# Altium footprint library AltiumLibraries.PcbLib: 247 footprints (part 1 of 16)
Each footprint in its own frame and in the unit in brackets; x right, y up, seen from the top. Pads: shape width x height; smd on the part's side, far side on the other; paste and mask are expansions set on the pad; w line width, h text height; cw(c..) or ccw(c..) is an arc to the next point about the centre after c.
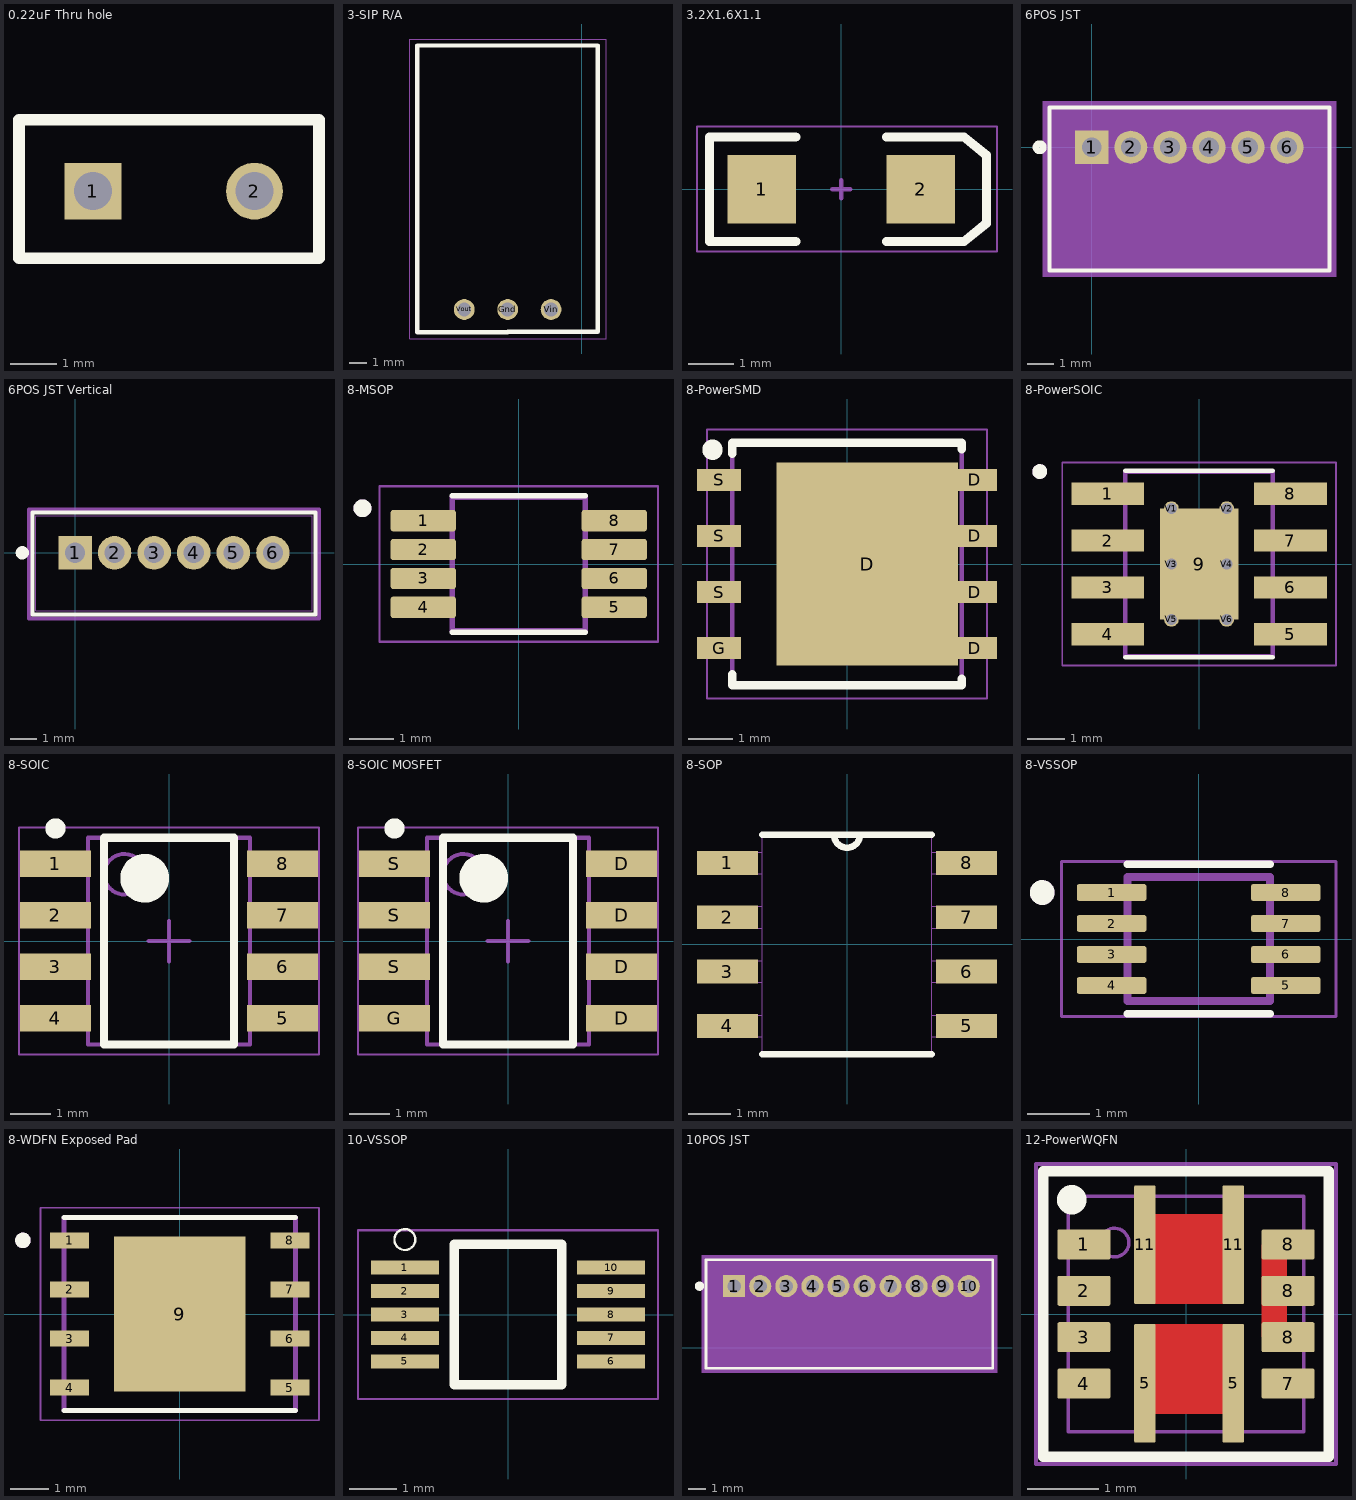
[diagram p0: the footprints below, top view; thin cyan lines are the x and y axes]

## 0.22uF Thru hole [mm]
pads (2):
  rect 1.23x1.23 hole 0.82: 1(-66.898,-218.047)
  round 1.23 hole 0.82: 2(-63.398,-218.047)
Top Overlay:
  lines w0.254: -68.5,-219.5 -62,-219.5 -62,-216.5 -68.5,-216.5 -68.5,-219.5

## 3-SIP R/A [mm]
pads (3):
  round 1.2 hole 0.8: Gnd(-4.273,-16.843) Vin(-1.773,-16.843) Vout(-6.773,-16.843)
Top Overlay:
  lines w0.254: -9.483,-11.193 -9.473,-11.193 ; -4.283,-18.143 -9.483,-18.143 -9.483,-1.643 0.917,-1.643 0.917,-18.133 -4.273,-18.133
Mechanical 15:
  lines w0.051: -9.906,-18.542 1.397,-18.542 1.397,-1.27 -9.906,-1.27 -9.906,-18.542
3D body: height 8.6, standoff 0, extent -9.463,-18.123 0.897,-1.583

## 3.2X1.6X1.1 [mm]
pads (2):
  rect 1.5x1.5 smd: 1(-1.75,0) 2(1.75,0)
Top Overlay:
  lines w0.2: -1,-1.15 -2.9,-1.15 -2.9,1.15 -1,1.15 ; 1,-1.15 2.7,-1.15 3.2,-0.75 3.2,0.75 2.7,1.15 1,1.15
Mechanical 1:
  lines w0.1: -0.2,0 0.2,0 ; 0,-0.2 0,0.2
Mechanical 15:
  lines w0.051: -3.175,-1.37 -3.175,1.38 3.43,1.38 3.43,-1.37 -3.175,-1.37
3D body "KP-3216P3C(AP214).STEP": height 1.04, standoff 0.01, extent -1.675,-0.75 1.525,0.85

## 6POS JST [mil]
pads (6):
  rect 50x50 hole 30 mask+0: 1(0,0)
  round 50 hole 30 mask+0: 2(59.06,0) 3(118.11,0) 4(177.17,0) 5(236.22,0) 6(295.28,0)
Top Overlay:
  circle w10: c-78.74,0 r5.57
  lines w6: -63.86,-186.1 359.14,-186.1 359.14,59.9 -63.86,59.9 -63.86,-186.1
Mechanical 5:
  region: -73.86,69.9 369.14,69.9 369.14,-196.1 -73.86,-196.1
Mechanical 13:
  lines w1: -58.86,-181.1 354.14,-181.1 354.14,54.9 -58.86,54.9 -58.86,-181.1
Mechanical 15:
  region: 364.14,64.9 -68.86,64.9 -68.86,-191.1 364.14,-191.1
  lines w6: -68.86,-191.1 -68.86,64.9 364.14,64.9 364.14,-191.1 -68.86,-191.1
3D body "S6B-ZR.STEP": height 147.64, standoff -104.33, extent -59.05,-181.1 354.34,55.12

## 6POS JST Vertical [mil]
pads (6):
  rect 50x50 hole 30 mask+0: 1(0,0)
  round 50 hole 30 mask+0: 2(59.06,0) 3(118.11,0) 4(177.17,0) 5(236.22,0) 6(295.28,0)
Top Overlay:
  circle w10: c-78.74,0 r4.92
  lines w6: -63.86,-92.3 359.14,-92.3 359.14,59.9 -63.86,59.9 -63.86,-92.3
Mechanical 13:
  lines w1: -58.86,-86.61 -58.86,54.9 354.14,54.9 354.14,-86.61 -58.86,-86.61
Mechanical 15:
  lines w6: -68.86,-98.43 -68.86,64.9 364.14,64.9 364.14,-98.43 -68.86,-98.43
3D body "B6B-ZR.STEP": height 177.17, standoff -106.3, extent -59.06,-86.62 354.33,51.18
3D body: height 10, standoff 0, extent 0,0 10,10

## 8-MSOP [mm]
pads (8):
  rrect25% 1.47x0.48 smd: 1(-2.15,0.975) 2(-2.15,0.325) 3(-2.15,-0.325) 4(-2.15,-0.975) 5(2.15,-0.975) 6(2.15,-0.325) 7(2.15,0.325) 8(2.15,0.975)
Top Overlay:
  circle w0.2: c-3.52,1.255 r0.1
  lines w0.127: -1.5,-1.535 1.5,-1.535 ; -1.5,1.535 1.5,1.535
Mechanical 13:
  circle w0.2: c-3.52,1.255 r0.1
  lines w0.127: -1.5,-1.5 -1.5,1.5 1.5,1.5 1.5,-1.5 -1.5,-1.5
Mechanical 15:
  lines w0.05: -3.135,-1.75 -3.135,1.75 3.135,1.75 3.135,-1.75 -3.135,-1.75
3D body "RM_8_ADI.step": height 1.09, standoff 0, extent -2.553,-1.6 2.604,1.6

## 8-PowerSMD [mm]
pads (9):
  rect 4.12x4.6 smd: D(0.46,0)
  rect 1x0.5 smd: D(2.9,-1.905) D(2.9,-0.635) D(2.9,0.635) D(2.9,1.905) G(-2.9,-1.905) S(-2.9,-0.635) S(-2.9,0.635) S(-2.9,1.905)
Top Overlay:
  circle w0.3: c-3.05,2.59 r0.08
  lines w0.2: -2.6,-2.5 -2.6,-2.75 2.6,-2.75 2.6,-2.6 ; -2.6,2.5 -2.6,2.75 2.6,2.75 2.6,2.6
Mechanical 4:
  lines w0.1: -2.6,-2.75 2.6,-2.75 ; -2.6,-2.75 -2.6,2.75 ; -2.6,-2.75 2.6,-2.75 ; -2.6,-2.75 -2.6,2.75 ; -2.6,2.75 2.6,2.75 ; -2.6,2.75 2.6,2.75 ; 2.6,-2.75 2.6,2.75 ; 2.6,-2.75 2.6,2.75
Mechanical 15:
  lines w0.05: -3.175,-3.048 3.175,-3.048 3.175,3.048 -3.175,3.048 -3.175,-3.048
3D body "8-POWERSMD.STEP": height 1.1, standoff 0, extent -3.075,-2.575 3.075,2.575

## 8-PowerSOIC [mm]
pads (15):
  rect 1.97x0.6 smd: 1(-2.475,1.905) 2(-2.475,0.635) 3(-2.475,-0.635) 4(-2.475,-1.905) 5(2.475,-1.905) 6(2.475,-0.635) 7(2.475,0.635) 8(2.475,1.905)
  rect 2.13x3 smd: 9(0,0)
  round 0.4 hole 0.3 mask+0.102: V1(-0.75,1.5) V2(0.75,1.5) V3(-0.75,0) V4(0.75,0) V5(-0.75,-1.5) V6(0.75,-1.5)
Top Overlay:
  circle w0.2: c-4.32,2.505 r0.1
  lines w0.127: -2,-2.525 2,-2.525 ; -2,2.525 2,2.525
Top Paste:
  region: -0.82,1.26 -0.12,1.26 -0.12,0.12 -0.82,0.12
  region: 0.12,1.26 0.82,1.26 0.82,0.12 0.12,0.12
  region: -0.82,-0.12 -0.12,-0.12 -0.12,-1.26 -0.82,-1.26
  region: 0.12,-0.12 0.82,-0.12 0.82,-1.26 0.12,-1.26
Top Solder:
  region: -1.47,2.445 1.47,2.445 1.47,-2.445 -1.47,-2.445
Mechanical 4:
  circle w0.2: c-4.32,2.505 r0.1
  circle w0.2: c-4.32,2.505 r0.1
  lines w0.127: -2,-2.5 2,-2.5 ; -2,-2.5 -2,2.5 ; -2,-2.5 2,-2.5 ; -2,-2.5 -2,2.5 ; -2,2.5 2,2.5 ; -2,2.5 2,2.5 ; 2,-2.5 2,2.5 ; 2,-2.5 2,2.5
Mechanical 15:
  lines w0.05: -3.71,-2.75 3.71,-2.75 3.71,2.75 -3.71,2.75 -3.71,-2.75
3D body "8-SOIC.step": height 1.68, standoff -0.05, extent -3.099,-2.489 3.099,2.489

## 8-SOIC [mm]
pads (8):
  rect 1.75x0.65 smd: 1(-2.8,1.905) 2(-2.8,0.635) 3(-2.8,-0.635) 4(-2.8,-1.905) 5(2.8,-1.905) 6(2.8,-0.635) 7(2.8,0.635) 8(2.8,1.905)
Top Overlay:
  circle w0.25: c-2.8,2.78 r0.125
  circle w0.6: c-0.6,1.55 r0.3
  lines w0.2: -1.6,-2.55 -1.6,2.55 1.6,2.55 1.6,-2.55 -1.6,-2.55
Mechanical 13:
  circle w0.1: c-1.1,1.65 r0.5
  lines w0.1: -2,-2.55 -2,2.55 2,2.55 2,-2.55 -2,-2.55
Mechanical 15:
  lines w0.05: -3.7,-2.8 -3.7,2.8 3.7,2.8 3.7,-2.8 -3.7,-2.8
  lines w0.1: -0.5,0 0.5,0 ; 0,-0.5 0,0.5
3D body: height 1.7, standoff 0.1, extent -2,-2.55 2,2.55

## 8-SOIC MOSFET [mm]
pads (8):
  rect 1.75x0.65 smd: D(2.8,-1.905) D(2.8,-0.635) D(2.8,0.635) D(2.8,1.905) G(-2.8,-1.905) S(-2.8,-0.635) S(-2.8,0.635) S(-2.8,1.905)
Top Overlay:
  circle w0.6: c-0.6,1.55 r0.3
  circle w0.25: c-2.8,2.78 r0.125
  lines w0.2: -1.6,-2.55 1.6,-2.55 1.6,2.55 -1.6,2.55 -1.6,-2.55
Mechanical 13:
  circle w0.1: c-1.1,1.65 r0.5
  lines w0.1: -2,-2.55 2,-2.55 2,2.55 -2,2.55 -2,-2.55
Mechanical 15:
  lines w0.05: -3.7,-2.8 3.7,-2.8 3.7,2.8 -3.7,2.8 -3.7,-2.8
  lines w0.1: -0.5,0 0.5,0 ; 0,-0.5 0,0.5
3D body: height 1.7, standoff 0.1, extent -2,-2.55 2,2.55

## 8-SOP [mil]
pads (8):
  rect 56x22 smd: 1(-110,75) 2(-110,25) 3(-110,-25) 4(-110,-75) 5(110,-75) 6(110,-25) 7(110,25) 8(110,75)
Top Overlay:
  lines w6: -78,-101 78,-101 ; -78,101 -12,101 ; 78,101 12,101 ; -12,101 ccw(c0,101) 12,101 ; -12,101 12,101
Mechanical 4:
  lines w0: -124,-85 -124,-65 ; -124,-85 -78,-85 ; -124,-85 -124,-65 ; -124,-85 -78,-85 ; -124,-65 -78,-65 ; -124,-65 -78,-65 ; -124,-35 -124,-15 ; -124,-35 -78,-35 ; -124,-35 -124,-15 ; -124,-35 -78,-35 ; -124,-15 -78,-15 ; -124,-15 -78,-15 ; -124,15 -124,35 ; -124,15 -78,15 ; -124,15 -124,35 ; -124,15 -78,15 ; -124,35 -78,35 ; -124,35 -78,35 ; -124,65 -124,85 ; -124,65 -78,65 ; -124,65 -124,85 ; -124,65 -78,65 ; -124,85 -78,85 ; -124,85 -78,85 ; -78,-101 78,-101 ; -78,-101 -78,101 ; -78,-101 78,-101 ; -78,-101 -78,101 ; -78,-85 -78,-65 ; -78,-85 -78,-65 ; -78,-35 -78,-15 ; -78,-35 -78,-15 ; -78,15 -78,35 ; -78,15 -78,35 ; -78,65 -78,85 ; -78,65 -78,85 ; -78,101 -12,101 ; -78,101 -12,101 ; -12,101 ccw(c0,101) 12,101 ; -12,101 ccw(c0,101) 12,101 ; -12,101 12,101 ; -12,101 12,101 ; 12,101 78,101 ; 12,101 78,101 ; 78,-101 78,101 ; 78,-101 78,101 ; 78,-85 78,-65 ; 78,-85 124,-85 ; 78,-85 78,-65 ; 78,-85 124,-85 ; 78,-65 124,-65 ; 78,-65 124,-65 ; 78,-35 78,-15 ; 78,-35 124,-35 ; 78,-35 78,-15 ; 78,-35 124,-35 ; 78,-15 124,-15 ; 78,-15 124,-15 ; 78,15 78,35 ; 78,15 124,15 ; 78,15 78,35 ; 78,15 124,15 ; 78,35 124,35 ; 78,35 124,35 ; 78,65 78,85 ; 78,65 124,65 ; 78,65 78,85 ; 78,65 124,65 ; 78,85 124,85 ; 78,85 124,85 ; 124,-85 124,-65 ; 124,-85 124,-65 ; 124,-35 124,-15 ; 124,-35 124,-15 ; 124,15 124,35 ; 124,15 124,35 ; 124,65 124,85 ; 124,65 124,85

## 8-VSSOP [mm]
pads (8):
  rrect25% 1.12x0.27 smd mask+0.065: 1(-1.405,0.75) 2(-1.405,0.25) 3(-1.405,-0.25) 4(-1.405,-0.75) 5(1.405,-0.75) 6(1.405,-0.25) 7(1.405,0.25) 8(1.405,0.75)
Top Overlay:
  circle w0.2: c-2.525,0.75 r0.1
  lines w0.127: -1.15,-1.205 1.15,-1.205 ; -1.15,1.205 1.15,1.205
Mechanical 13:
  circle w0.2: c-2.525,0.75 r0.1
  lines w0.127: -1.15,-1 -1.15,1 1.15,1 1.15,-1 -1.15,-1
Mechanical 15:
  lines w0.05: -2.215,-1.25 -2.215,1.25 2.215,1.25 2.215,-1.25 -2.215,-1.25
3D body "8-VSSOP.STEP": height 0.9, standoff 0, extent -1.55,-1 1.55,1

## 8-WDFN Exposed Pad [mm]
pads (9):
  rect 1.01x0.42 smd: 1(-2.85,1.905) 2(-2.85,0.635) 3(-2.85,-0.635) 4(-2.85,-1.905) 5(2.85,-1.905) 6(2.85,-0.635) 7(2.85,0.635) 8(2.85,1.905)
  rect 3.4x4 smd: 9(0,0)
Top Overlay:
  circle w0.2: c-4.06,1.905 r0.1
  lines w0.127: -3,-2.5 3,-2.5 ; -3,2.5 3,2.5
Top Paste:
  region: -1.08,1.26 1.08,1.26 1.08,-1.26 -1.08,-1.26
Mechanical 4:
  circle w0.2: c-4.06,1.905 r0.1
  circle w0.2: c-4.06,1.905 r0.1
  lines w0.127: -3,-2.5 3,-2.5 ; -3,-2.5 -3,2.5 ; -3,-2.5 3,-2.5 ; -3,-2.5 -3,2.5 ; -3,2.5 3,2.5 ; -3,2.5 3,2.5 ; 3,-2.5 3,2.5 ; 3,-2.5 3,2.5
Mechanical 16:
  lines w0.05: -3.605,-2.75 3.605,-2.75 3.605,2.75 -3.605,2.75 -3.605,-2.75

## 10-VSSOP [mm]
pads (10):
  rect 1.45x0.3 smd: 1(-2.2,1) 2(-2.2,0.5) 3(-2.2,0) 4(-2.2,-0.5) 5(-2.2,-1) 6(2.2,-1) 7(2.2,-0.5) 8(2.2,0) 9(2.2,0.5) 10(2.2,1)
Top Overlay:
  circle w0.05: c-2.2,1.6 r0.224
  lines w0.2: -1.15,-1.5 -1.15,1.5 1.15,1.5 1.15,-1.5 -1.15,-1.5
Mechanical 15:
  lines w0.05: -3.2,-1.8 -3.2,1.8 3.2,1.8 3.2,-1.8 -3.2,-1.8

## 10POS JST [mm]
pads (10):
  rect 1.27x1.27 hole 0.762 mask+0: 1(5.035,3.535)
  round 1.27 hole 0.762 mask+0: 2(6.535,3.535) 3(8.035,3.535) 4(9.535,3.535) 5(11.035,3.535) 6(12.535,3.535) 7(14.035,3.535) 8(15.535,3.535) 9(17.035,3.535) 10(18.535,3.535)
Top Overlay:
  circle w0.254: c3.035,3.535 r0.141
  lines w0.152: 3.413,-1.192 3.413,5.056 19.925,5.056 19.925,-1.192 3.413,-1.192
Mechanical 5:
  region: 3.159,5.31 20.16,5.31 20.16,-1.446 3.159,-1.446
Mechanical 13:
  lines w0.025: 3.54,-1.065 3.54,4.929 14.03,4.929 14.03,-1.065 3.54,-1.065
Mechanical 15:
  region: 14.284,5.183 3.286,5.183 3.286,-1.319 14.284,-1.319
  lines w0.152: 3.286,-1.319 14.284,-1.319 14.284,5.183 3.286,5.183 3.286,-1.319

## 12-PowerWQFN [mm] "MOSFET DUAL SWITCHING N CHANNEL"
pads (12):
  rrect10% 0.74x0.42 smd mask+0.065: 1(-1.43,0.975) 2(-1.43,0.325) 3(-1.43,-0.325) 4(-1.43,-0.975) 7(1.43,-0.975) 8(1.43,-0.325) 8(1.43,0.325) 8(1.43,0.975)
  rrect10% 0.3x1.66 smd mask+0.065: 5(-0.575,-0.97) 5(0.66,-0.97) 11(-0.575,0.97) 11(0.66,0.97)
Top Layer:
  region: -0.575,1.4 -0.575,0.14 0.66,0.14 0.66,1.4
  region: 1.414,-0.325 1.414,0.975 1.06,0.975 1.06,-0.325
  region: 0.66,-1.4 0.66,-0.14 -0.575,-0.14 -0.575,-1.4
Top Overlay:
  circle w0.254: c-1.6,1.6 r0.079
  lines w0.152: -2,-2 -2,2 2,2 2,-2 -2,-2
Mechanical 13:
  circle w0.05: c-1,1 r0.2
  lines w0.05: -1.65,-1.65 1.65,-1.65 1.65,1.65 -1.65,1.65 -1.65,-1.65
Mechanical 15:
  lines w0.05: -2.101,-2.101 2.101,-2.101 2.101,2.101 -2.101,2.101 -2.101,-2.101
3D body "NTTFD4D0N04HL.step": height 0.81, standoff 0.01, extent -1.65,-1.65 1.65,1.65